# Altium footprint library My Footprint 3D.PCBLIB: 447 footprints (part 26 of 29)
Each footprint in its own frame and in the unit in brackets; x right, y up, seen from the top. Pads: shape width x height; smd on the part's side, far side on the other; paste and mask are expansions set on the pad; w line width, h text height; cw(c..) or ccw(c..) is an arc to the next point about the centre after c.
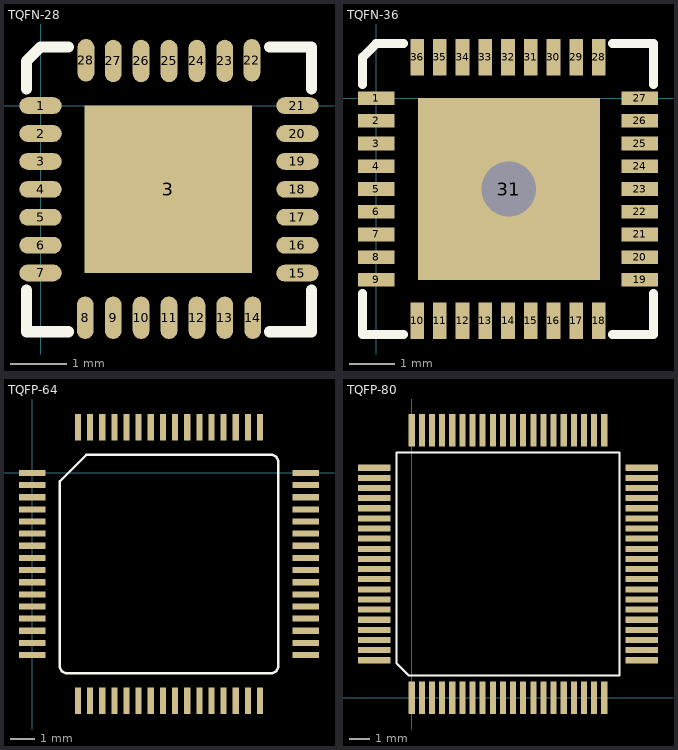
[diagram p25: the footprints below, top view; thin cyan lines are the x and y axes]

## TQFN-28 [mm]
height 1
pads (29):
  oval 0.76x0.3 smd: 1(0,0) 2(0,-0.5) 3(0,-1) 4(0,-1.5) 5(0,-2) 6(0,-2.5) 7(0,-2.997) 15(4.6,-3) 16(4.6,-2.5) 17(4.6,-2) 18(4.6,-1.5) 19(4.6,-1) 20(4.6,-0.5) 21(4.6,0)
  rect 3x3 smd: 3(2.286,-1.5)
  oval 0.3x0.76 smd: 8(0.8,-3.8) 9(1.3,-3.8) 10(1.8,-3.8) 11(2.3,-3.8) 12(2.8,-3.8) 13(3.3,-3.8) 14(3.8,-3.8) 22(3.785,0.813) 23(3.3,0.8) 24(2.8,0.8) 25(2.3,0.8) 26(1.8,0.8) 27(1.3,0.8) 28(0.813,0.813)
Top Overlay:
  lines w0.2: -0.25,-3.3 -0.25,-4.05 0.5,-4.05 ; -0.25,0.3 -0.25,0.8 0,1.05 0.5,1.05 ; 4.1,-4.05 4.85,-4.05 4.85,-3.3 ; 4.1,1.05 4.85,1.05 4.85,0.3

## TQFN-36 [mm]
pads (37):
  rect 0.8x0.3 smd: 1(0,0) 2(0,-0.5) 3(0,-1) 4(0,-1.5) 5(0,-2) 6(0,-2.5) 7(0,-3) 8(0,-3.5) 9(0,-4) 19(5.8,-4) 20(5.8,-3.5) 21(5.8,-3) 22(5.8,-2.5) 23(5.8,-2) 24(5.8,-1.5) 25(5.8,-1) 26(5.8,-0.5) 27(5.8,0)
  rect 0.3x0.8 smd: 10(0.9,-4.9) 11(1.4,-4.9) 12(1.9,-4.9) 13(2.4,-4.9) 14(2.9,-4.9) 15(3.4,-4.9) 16(3.9,-4.9) 17(4.4,-4.9) 18(4.9,-4.9) 28(4.9,0.9) 29(4.4,0.9) 30(3.9,0.9) 31(3.4,0.9) 32(2.9,0.9) 33(2.4,0.9) 34(1.9,0.9) 35(1.4,0.9) 36(0.9,0.9)
  rect 4x4 hole 1.2: 31(2.921,-2)
Top Overlay:
  lines w0.2: -0.3,-4.3 -0.3,-5.2 0.6,-5.2 ; -0.3,0.3 -0.3,0.9 0,1.2 0.6,1.2 ; 5.2,-5.2 6.1,-5.2 6.1,-4.3 ; 5.2,1.2 6.1,1.2 6.1,0.3

## TQFP-64 [mm]
pads (64):
  rect 1.1x0.254 smd: 1(0,0) 2(0,-0.5) 3(0,-1) 4(0,-1.5) 5(0,-2) 6(0,-2.5) 7(0,-3) 8(0,-3.5) 9(0,-4) 10(0,-4.5) 11(0,-5) 12(0,-5.5) 13(0,-6) 14(0,-6.5) 15(0,-7) 16(0,-7.5) 33(11.25,-7.5) 34(11.25,-7) 35(11.25,-6.5) 36(11.25,-6) 37(11.25,-5.5) 38(11.25,-5) 39(11.25,-4.5) 40(11.25,-4) 41(11.25,-3.5) 42(11.25,-3) 43(11.25,-2.5) 44(11.25,-2) 45(11.25,-1.5) 46(11.25,-1) 47(11.25,-0.5) 48(11.25,0)
  rect 0.254x1.1 smd: 17(1.875,-9.375) 18(2.375,-9.375) 19(2.875,-9.375) 20(3.375,-9.375) 21(3.875,-9.375) 22(4.375,-9.375) 23(4.875,-9.375) 24(5.375,-9.375) 25(5.875,-9.375) 26(6.375,-9.375) 27(6.875,-9.375) 28(7.375,-9.375) 29(7.875,-9.375) 30(8.375,-9.375) 31(8.875,-9.375) 32(9.375,-9.375) 49(9.375,1.875) 50(8.875,1.875) 51(8.375,1.875) 52(7.875,1.875) 53(7.375,1.875) 54(6.875,1.875) 55(6.375,1.875) 56(5.875,1.875) 57(5.375,1.875) 58(4.875,1.875) 59(4.375,1.875) 60(3.875,1.875) 61(3.375,1.875) 62(2.875,1.875) 63(2.375,1.875) 64(1.875,1.875)
Top Overlay:
  lines w0.1: 1.125,-7.95 ccw(c1.425,-7.95) 1.425,-8.25 9.825,-8.25 ccw(c9.825,-7.95) 10.125,-7.95 10.125,0.45 ccw(c9.825,0.45) 9.825,0.75 2.225,0.75 1.125,-0.35 1.125,-7.95
3D body: height 1, standoff 0.1, extent 0.623,-8.75 10.628,1.251
3D body: height 1.11, standoff 0.1, extent 1.177,-0.4 2.173,0.598
3D body: height 0.5, standoff 0.3, extent 0.255,-4.11 0.625,-3.89
3D body: height 0.5, standoff 0, extent 0.075,-4.11 0.255,-3.89
3D body: height 0.2, standoff 0, extent -0.375,-4.11 0.075,-3.89
3D body: height 0.2, standoff 0, extent -0.375,-3.61 0.075,-3.39
3D body: height 0.5, standoff 0, extent 0.075,-3.61 0.255,-3.39
3D body: height 0.5, standoff 0.3, extent 0.255,-3.61 0.625,-3.39
3D body: height 0.5, standoff 0.3, extent 0.255,-3.11 0.625,-2.89
3D body: height 0.5, standoff 0, extent 0.075,-3.11 0.255,-2.89
3D body: height 0.2, standoff 0, extent -0.375,-3.11 0.075,-2.89
3D body: height 0.5, standoff 0.3, extent 0.255,-2.61 0.625,-2.39
3D body: height 0.5, standoff 0, extent 0.075,-2.61 0.255,-2.39
3D body: height 0.2, standoff 0, extent -0.375,-2.61 0.075,-2.39
3D body: height 0.5, standoff 0.3, extent 0.255,-2.11 0.625,-1.89
3D body: height 0.5, standoff 0, extent 0.075,-2.11 0.255,-1.89
3D body: height 0.2, standoff 0, extent -0.375,-2.11 0.075,-1.89
3D body: height 0.2, standoff 0, extent -0.375,-0.11 0.075,0.11
3D body: height 0.5, standoff 0, extent 0.075,-0.11 0.255,0.11
3D body: height 0.5, standoff 0.3, extent 0.255,-0.11 0.625,0.11
3D body: height 0.2, standoff 0, extent -0.375,-0.61 0.075,-0.39
3D body: height 0.5, standoff 0, extent 0.075,-0.61 0.255,-0.39
3D body: height 0.5, standoff 0.3, extent 0.255,-0.61 0.625,-0.39
3D body: height 0.2, standoff 0, extent -0.375,-1.11 0.075,-0.89
3D body: height 0.5, standoff 0, extent 0.075,-1.11 0.255,-0.89
3D body: height 0.5, standoff 0.3, extent 0.255,-1.11 0.625,-0.89
3D body: height 0.5, standoff 0.3, extent 0.255,-1.61 0.625,-1.39
3D body: height 0.5, standoff 0, extent 0.075,-1.61 0.255,-1.39
3D body: height 0.2, standoff 0, extent -0.375,-1.61 0.075,-1.39
3D body: height 0.2, standoff 0, extent -0.375,-6.11 0.075,-5.89
3D body: height 0.5, standoff 0, extent 0.075,-6.11 0.255,-5.89
3D body: height 0.5, standoff 0.3, extent 0.255,-6.11 0.625,-5.89
3D body: height 0.2, standoff 0, extent -0.375,-5.61 0.075,-5.39
3D body: height 0.5, standoff 0, extent 0.075,-5.61 0.255,-5.39
3D body: height 0.5, standoff 0.3, extent 0.255,-5.61 0.625,-5.39
3D body: height 0.2, standoff 0, extent -0.375,-5.11 0.075,-4.89
3D body: height 0.5, standoff 0, extent 0.075,-5.11 0.255,-4.89
3D body: height 0.5, standoff 0.3, extent 0.255,-5.11 0.625,-4.89
3D body: height 0.5, standoff 0.3, extent 0.255,-4.61 0.625,-4.39
3D body: height 0.5, standoff 0, extent 0.075,-4.61 0.255,-4.39
3D body: height 0.2, standoff 0, extent -0.375,-4.61 0.075,-4.39
3D body: height 0.2, standoff 0, extent -0.375,-7.61 0.075,-7.39
3D body: height 0.5, standoff 0, extent 0.075,-7.61 0.255,-7.39
3D body: height 0.5, standoff 0.3, extent 0.255,-7.61 0.625,-7.39
3D body: height 0.2, standoff 0, extent -0.375,-7.11 0.075,-6.89
3D body: height 0.5, standoff 0, extent 0.075,-7.11 0.255,-6.89
3D body: height 0.5, standoff 0.3, extent 0.255,-7.11 0.625,-6.89
3D body: height 0.5, standoff 0.3, extent 0.255,-6.61 0.625,-6.39
3D body: height 0.5, standoff 0, extent 0.075,-6.61 0.255,-6.39
3D body: height 0.2, standoff 0, extent -0.375,-6.61 0.075,-6.39
3D body: height 0.2, standoff 0, extent 8.265,-9.75 8.485,-9.3
3D body: height 0.5, standoff 0, extent 8.265,-9.3 8.485,-9.12
3D body: height 0.5, standoff 0.3, extent 8.265,-9.12 8.485,-8.75
3D body: height 0.5, standoff 0.3, extent 8.765,-9.12 8.985,-8.75
3D body: height 0.5, standoff 0, extent 8.765,-9.3 8.985,-9.12
3D body: height 0.2, standoff 0, extent 8.765,-9.75 8.985,-9.3
3D body: height 0.5, standoff 0.3, extent 9.265,-9.12 9.485,-8.75
3D body: height 0.5, standoff 0, extent 9.265,-9.3 9.485,-9.12
3D body: height 0.2, standoff 0, extent 9.265,-9.75 9.485,-9.3
3D body: height 0.2, standoff 0, extent 6.265,-9.75 6.485,-9.3
3D body: height 0.5, standoff 0, extent 6.265,-9.3 6.485,-9.12
3D body: height 0.5, standoff 0.3, extent 6.265,-9.12 6.485,-8.75
3D body: height 0.5, standoff 0.3, extent 6.765,-9.12 6.985,-8.75
3D body: height 0.5, standoff 0, extent 6.765,-9.3 6.985,-9.12
3D body: height 0.2, standoff 0, extent 6.765,-9.75 6.985,-9.3
3D body: height 0.5, standoff 0.3, extent 7.265,-9.12 7.485,-8.75
3D body: height 0.5, standoff 0, extent 7.265,-9.3 7.485,-9.12
3D body: height 0.2, standoff 0, extent 7.265,-9.75 7.485,-9.3
3D body: height 0.5, standoff 0.3, extent 7.765,-9.12 7.985,-8.75
3D body: height 0.5, standoff 0, extent 7.765,-9.3 7.985,-9.12
3D body: height 0.2, standoff 0, extent 7.765,-9.75 7.985,-9.3
3D body: height 0.2, standoff 0, extent 3.265,-9.75 3.485,-9.3
3D body: height 0.5, standoff 0, extent 3.265,-9.3 3.485,-9.12
3D body: height 0.5, standoff 0.3, extent 3.265,-9.12 3.485,-8.75
3D body: height 0.5, standoff 0.3, extent 2.765,-9.12 2.985,-8.75
3D body: height 0.5, standoff 0, extent 2.765,-9.3 2.985,-9.12
3D body: height 0.2, standoff 0, extent 2.765,-9.75 2.985,-9.3
3D body: height 0.5, standoff 0.3, extent 2.265,-9.12 2.485,-8.75
3D body: height 0.5, standoff 0, extent 2.265,-9.3 2.485,-9.12
3D body: height 0.2, standoff 0, extent 2.265,-9.75 2.485,-9.3
3D body: height 0.5, standoff 0.3, extent 1.765,-9.12 1.985,-8.75
3D body: height 0.5, standoff 0, extent 1.765,-9.3 1.985,-9.12
3D body: height 0.2, standoff 0, extent 1.765,-9.75 1.985,-9.3
3D body: height 0.2, standoff 0, extent 3.765,-9.75 3.985,-9.3
3D body: height 0.5, standoff 0, extent 3.765,-9.3 3.985,-9.12
3D body: height 0.5, standoff 0.3, extent 3.765,-9.12 3.985,-8.75
3D body: height 0.2, standoff 0, extent 4.265,-9.75 4.485,-9.3
3D body: height 0.5, standoff 0, extent 4.265,-9.3 4.485,-9.12
3D body: height 0.5, standoff 0.3, extent 4.265,-9.12 4.485,-8.75
3D body: height 0.2, standoff 0, extent 4.765,-9.75 4.985,-9.3
3D body: height 0.5, standoff 0, extent 4.765,-9.3 4.985,-9.12
3D body: height 0.5, standoff 0.3, extent 4.765,-9.12 4.985,-8.75
3D body: height 0.5, standoff 0.3, extent 5.265,-9.12 5.485,-8.75
3D body: height 0.5, standoff 0, extent 5.265,-9.3 5.485,-9.12
3D body: height 0.2, standoff 0, extent 5.265,-9.75 5.485,-9.3
3D body: height 0.2, standoff 0, extent 5.765,-9.75 5.985,-9.3
3D body: height 0.5, standoff 0, extent 5.765,-9.3 5.985,-9.12
3D body: height 0.5, standoff 0.3, extent 5.765,-9.12 5.985,-8.75
3D body: height 0.2, standoff 0, extent 11.175,-1.11 11.625,-0.89
3D body: height 0.5, standoff 0, extent 10.995,-1.11 11.175,-0.89
3D body: height 0.5, standoff 0.3, extent 10.625,-1.11 10.995,-0.89
3D body: height 0.5, standoff 0.3, extent 10.625,-0.61 10.995,-0.39
3D body: height 0.5, standoff 0, extent 10.995,-0.61 11.175,-0.39
3D body: height 0.2, standoff 0, extent 11.175,-0.61 11.625,-0.39
3D body: height 0.5, standoff 0.3, extent 10.625,-0.11 10.995,0.11
3D body: height 0.5, standoff 0, extent 10.995,-0.11 11.175,0.11
3D body: height 0.2, standoff 0, extent 11.175,-0.11 11.625,0.11
3D body: height 0.2, standoff 0, extent 11.175,-3.11 11.625,-2.89
3D body: height 0.5, standoff 0, extent 10.995,-3.11 11.175,-2.89
3D body: height 0.5, standoff 0.3, extent 10.625,-3.11 10.995,-2.89
3D body: height 0.5, standoff 0.3, extent 10.625,-2.61 10.995,-2.39
3D body: height 0.5, standoff 0, extent 10.995,-2.61 11.175,-2.39
3D body: height 0.2, standoff 0, extent 11.175,-2.61 11.625,-2.39
3D body: height 0.5, standoff 0.3, extent 10.625,-2.11 10.995,-1.89
3D body: height 0.5, standoff 0, extent 10.995,-2.11 11.175,-1.89
3D body: height 0.2, standoff 0, extent 11.175,-2.11 11.625,-1.89
3D body: height 0.5, standoff 0.3, extent 10.625,-1.61 10.995,-1.39
3D body: height 0.5, standoff 0, extent 10.995,-1.61 11.175,-1.39
3D body: height 0.2, standoff 0, extent 11.175,-1.61 11.625,-1.39
3D body: height 0.2, standoff 0, extent 11.175,-6.11 11.625,-5.89
3D body: height 0.5, standoff 0, extent 10.995,-6.11 11.175,-5.89
3D body: height 0.5, standoff 0.3, extent 10.625,-6.11 10.995,-5.89
3D body: height 0.5, standoff 0.3, extent 10.625,-6.61 10.995,-6.39
3D body: height 0.5, standoff 0, extent 10.995,-6.61 11.175,-6.39
3D body: height 0.2, standoff 0, extent 11.175,-6.61 11.625,-6.39
3D body: height 0.5, standoff 0.3, extent 10.625,-7.11 10.995,-6.89
3D body: height 0.5, standoff 0, extent 10.995,-7.11 11.175,-6.89
3D body: height 0.2, standoff 0, extent 11.175,-7.11 11.625,-6.89
3D body: height 0.5, standoff 0.3, extent 10.625,-7.61 10.995,-7.39
3D body: height 0.5, standoff 0, extent 10.995,-7.61 11.175,-7.39
3D body: height 0.2, standoff 0, extent 11.175,-7.61 11.625,-7.39
3D body: height 0.2, standoff 0, extent 11.175,-5.61 11.625,-5.39
3D body: height 0.5, standoff 0, extent 10.995,-5.61 11.175,-5.39
3D body: height 0.5, standoff 0.3, extent 10.625,-5.61 10.995,-5.39
3D body: height 0.2, standoff 0, extent 11.175,-5.11 11.625,-4.89
3D body: height 0.5, standoff 0, extent 10.995,-5.11 11.175,-4.89
3D body: height 0.5, standoff 0.3, extent 10.625,-5.11 10.995,-4.89
3D body: height 0.2, standoff 0, extent 11.175,-4.61 11.625,-4.39
3D body: height 0.5, standoff 0, extent 10.995,-4.61 11.175,-4.39
3D body: height 0.5, standoff 0.3, extent 10.625,-4.61 10.995,-4.39
3D body: height 0.5, standoff 0.3, extent 10.625,-4.11 10.995,-3.89
3D body: height 0.5, standoff 0, extent 10.995,-4.11 11.175,-3.89
3D body: height 0.2, standoff 0, extent 11.175,-4.11 11.625,-3.89
3D body: height 0.2, standoff 0, extent 11.175,-3.61 11.625,-3.39
3D body: height 0.5, standoff 0, extent 10.995,-3.61 11.175,-3.39
3D body: height 0.5, standoff 0.3, extent 10.625,-3.61 10.995,-3.39
3D body: height 0.2, standoff 0, extent 2.765,1.8 2.985,2.25
3D body: height 0.5, standoff 0, extent 2.765,1.62 2.985,1.8
3D body: height 0.5, standoff 0.3, extent 2.765,1.25 2.985,1.62
3D body: height 0.5, standoff 0.3, extent 2.265,1.25 2.485,1.62
3D body: height 0.5, standoff 0, extent 2.265,1.62 2.485,1.8
3D body: height 0.2, standoff 0, extent 2.265,1.8 2.485,2.25
3D body: height 0.5, standoff 0.3, extent 1.765,1.25 1.985,1.62
3D body: height 0.5, standoff 0, extent 1.765,1.62 1.985,1.8
3D body: height 0.2, standoff 0, extent 1.765,1.8 1.985,2.25
3D body: height 0.2, standoff 0, extent 4.765,1.8 4.985,2.25
3D body: height 0.5, standoff 0, extent 4.765,1.62 4.985,1.8
3D body: height 0.5, standoff 0.3, extent 4.765,1.25 4.985,1.62
3D body: height 0.5, standoff 0.3, extent 4.265,1.25 4.485,1.62
3D body: height 0.5, standoff 0, extent 4.265,1.62 4.485,1.8
3D body: height 0.2, standoff 0, extent 4.265,1.8 4.485,2.25
3D body: height 0.5, standoff 0.3, extent 3.765,1.25 3.985,1.62
3D body: height 0.5, standoff 0, extent 3.765,1.62 3.985,1.8
3D body: height 0.2, standoff 0, extent 3.765,1.8 3.985,2.25
3D body: height 0.5, standoff 0.3, extent 3.265,1.25 3.485,1.62
3D body: height 0.5, standoff 0, extent 3.265,1.62 3.485,1.8
3D body: height 0.2, standoff 0, extent 3.265,1.8 3.485,2.25
3D body: height 0.2, standoff 0, extent 7.765,1.8 7.985,2.25
3D body: height 0.5, standoff 0, extent 7.765,1.62 7.985,1.8
3D body: height 0.5, standoff 0.3, extent 7.765,1.25 7.985,1.62
3D body: height 0.5, standoff 0.3, extent 8.265,1.25 8.485,1.62
3D body: height 0.5, standoff 0, extent 8.265,1.62 8.485,1.8
3D body: height 0.2, standoff 0, extent 8.265,1.8 8.485,2.25
3D body: height 0.5, standoff 0.3, extent 8.765,1.25 8.985,1.62
3D body: height 0.5, standoff 0, extent 8.765,1.62 8.985,1.8
3D body: height 0.2, standoff 0, extent 8.765,1.8 8.985,2.25
3D body: height 0.5, standoff 0.3, extent 9.265,1.25 9.485,1.62
3D body: height 0.5, standoff 0, extent 9.265,1.62 9.485,1.8
3D body: height 0.2, standoff 0, extent 9.265,1.8 9.485,2.25
3D body: height 0.2, standoff 0, extent 7.265,1.8 7.485,2.25
3D body: height 0.5, standoff 0, extent 7.265,1.62 7.485,1.8
3D body: height 0.5, standoff 0.3, extent 7.265,1.25 7.485,1.62
3D body: height 0.2, standoff 0, extent 6.765,1.8 6.985,2.25
3D body: height 0.5, standoff 0, extent 6.765,1.62 6.985,1.8
3D body: height 0.5, standoff 0.3, extent 6.765,1.25 6.985,1.62
3D body: height 0.2, standoff 0, extent 6.265,1.8 6.485,2.25
3D body: height 0.5, standoff 0, extent 6.265,1.62 6.485,1.8
3D body: height 0.5, standoff 0.3, extent 6.265,1.25 6.485,1.62
3D body: height 0.5, standoff 0.3, extent 5.765,1.25 5.985,1.62
3D body: height 0.5, standoff 0, extent 5.765,1.62 5.985,1.8
3D body: height 0.2, standoff 0, extent 5.765,1.8 5.985,2.25
3D body: height 0.2, standoff 0, extent 5.265,1.8 5.485,2.25
3D body: height 0.5, standoff 0, extent 5.265,1.62 5.485,1.8
3D body: height 0.5, standoff 0.3, extent 5.265,1.25 5.485,1.62

## TQFP-80 [mm]
height 2
pads (80):
  rect 0.3x1.6 smd: 1(0,0) 2(0.5,0) 3(1,0) 4(1.5,0) 5(2,0) 6(2.5,0) 7(3,0) 8(3.5,0) 9(4,0) 10(4.5,0) 11(5,0) 12(5.5,0) 13(6,0) 14(6.5,0) 15(7,0) 16(7.5,0) 17(8,0) 18(8.5,0) 19(9,0) 20(9.5,0) 41(9.5,13.2) 42(9,13.2) 43(8.5,13.2) 44(8,13.2) 45(7.5,13.2) 46(7,13.2) 47(6.5,13.2) 48(6,13.2) 49(5.5,13.2) 50(5,13.2) 51(4.5,13.2) 52(4,13.2) 53(3.5,13.2) 54(3,13.2) 55(2.5,13.2) 56(2,13.2) 57(1.5,13.2) 58(1,13.2) 59(0.5,13.2) 60(0,13.2)
  rect 1.6x0.3 smd: 21(11.35,1.85) 22(11.35,2.35) 23(11.35,2.85) 24(11.35,3.35) 25(11.35,3.85) 26(11.35,4.35) 27(11.35,4.85) 28(11.35,5.35) 29(11.35,5.85) 30(11.35,6.35) 31(11.35,6.85) 32(11.35,7.35) 33(11.35,7.85) 34(11.35,8.35) 35(11.35,8.85) 36(11.35,9.35) 37(11.35,9.85) 38(11.35,10.35) 39(11.35,10.85) 40(11.35,11.35) 61(-1.85,11.35) 62(-1.85,10.85) 63(-1.85,10.35) 64(-1.85,9.85) 65(-1.85,9.35) 66(-1.85,8.85) 67(-1.85,8.35) 68(-1.85,7.85) 69(-1.85,7.35) 70(-1.85,6.85) 71(-1.85,6.35) 72(-1.85,5.85) 73(-1.85,5.35) 74(-1.85,4.85) 75(-1.85,4.35) 76(-1.85,3.85) 77(-1.85,3.35) 78(-1.85,2.85) 79(-1.85,2.35) 80(-1.85,1.85)
Top Overlay:
  lines w0.1: -0.75,1.7 -0.15,1.1 10.25,1.1 10.25,12.1 -0.75,12.1 -0.75,1.7
3D body: height 1, standoff 0.1, extent -1.25,0.6 10.75,12.6
3D body: height 1.11, standoff 0.1, extent -0.598,1.202 0.4,2.198
3D body: height 0.5, standoff 0.3, extent -0.102,0.4 0.102,0.775
3D body: height 0.5, standoff 0, extent -0.102,0.222 0.102,0.4
3D body: height 0.2, standoff 0, extent -0.102,-0.478 0.102,0.222
3D body: height 0.2, standoff 0, extent 0.398,-0.478 0.602,0.222
3D body: height 0.5, standoff 0, extent 0.398,0.222 0.602,0.4
3D body: height 0.5, standoff 0.3, extent 0.398,0.4 0.602,0.775
3D body: height 0.2, standoff 0, extent 0.898,-0.478 1.102,0.222
3D body: height 0.5, standoff 0, extent 0.898,0.222 1.102,0.4
3D body: height 0.5, standoff 0.3, extent 0.898,0.4 1.102,0.775
3D body: height 0.2, standoff 0, extent 1.398,-0.478 1.602,0.222
3D body: height 0.5, standoff 0, extent 1.398,0.222 1.602,0.4
3D body: height 0.5, standoff 0.3, extent 1.398,0.4 1.602,0.775
3D body: height 0.2, standoff 0, extent 1.898,-0.478 2.102,0.222
3D body: height 0.5, standoff 0, extent 1.898,0.222 2.102,0.4
3D body: height 0.5, standoff 0.3, extent 1.898,0.4 2.102,0.775
3D body: height 0.5, standoff 0.3, extent 4.398,0.4 4.602,0.775
3D body: height 0.5, standoff 0, extent 4.398,0.222 4.602,0.4
3D body: height 0.2, standoff 0, extent 4.398,-0.478 4.602,0.222
3D body: height 0.5, standoff 0.3, extent 3.898,0.4 4.102,0.775
3D body: height 0.5, standoff 0, extent 3.898,0.222 4.102,0.4
3D body: height 0.2, standoff 0, extent 3.898,-0.478 4.102,0.222
3D body: height 0.5, standoff 0.3, extent 3.398,0.4 3.602,0.775
3D body: height 0.5, standoff 0, extent 3.398,0.222 3.602,0.4
3D body: height 0.2, standoff 0, extent 3.398,-0.478 3.602,0.222
3D body: height 0.5, standoff 0.3, extent 2.898,0.4 3.102,0.775
3D body: height 0.5, standoff 0, extent 2.898,0.222 3.102,0.4
3D body: height 0.2, standoff 0, extent 2.898,-0.478 3.102,0.222
3D body: height 0.2, standoff 0, extent 2.398,-0.478 2.602,0.222
3D body: height 0.5, standoff 0, extent 2.398,0.222 2.602,0.4
3D body: height 0.5, standoff 0.3, extent 2.398,0.4 2.602,0.775
3D body: height 0.5, standoff 0.3, extent 6.898,0.4 7.102,0.775
3D body: height 0.5, standoff 0, extent 6.898,0.222 7.102,0.4
3D body: height 0.2, standoff 0, extent 6.898,-0.478 7.102,0.222
3D body: height 0.5, standoff 0.3, extent 6.398,0.4 6.602,0.775
3D body: height 0.5, standoff 0, extent 6.398,0.222 6.602,0.4
3D body: height 0.2, standoff 0, extent 6.398,-0.478 6.602,0.222
3D body: height 0.5, standoff 0.3, extent 5.898,0.4 6.102,0.775
3D body: height 0.5, standoff 0, extent 5.898,0.222 6.102,0.4
3D body: height 0.2, standoff 0, extent 5.898,-0.478 6.102,0.222
3D body: height 0.5, standoff 0.3, extent 5.398,0.4 5.602,0.775
3D body: height 0.5, standoff 0, extent 5.398,0.222 5.602,0.4
3D body: height 0.2, standoff 0, extent 5.398,-0.478 5.602,0.222
3D body: height 0.2, standoff 0, extent 4.898,-0.478 5.102,0.222
3D body: height 0.5, standoff 0, extent 4.898,0.222 5.102,0.4
3D body: height 0.5, standoff 0.3, extent 4.898,0.4 5.102,0.775
3D body: height 0.5, standoff 0.3, extent 9.398,0.4 9.602,0.775
3D body: height 0.5, standoff 0, extent 9.398,0.222 9.602,0.4
3D body: height 0.2, standoff 0, extent 9.398,-0.478 9.602,0.222
3D body: height 0.5, standoff 0.3, extent 8.898,0.4 9.102,0.775
3D body: height 0.5, standoff 0, extent 8.898,0.222 9.102,0.4
3D body: height 0.2, standoff 0, extent 8.898,-0.478 9.102,0.222
3D body: height 0.5, standoff 0.3, extent 8.398,0.4 8.602,0.775
3D body: height 0.5, standoff 0, extent 8.398,0.222 8.602,0.4
3D body: height 0.2, standoff 0, extent 8.398,-0.478 8.602,0.222
3D body: height 0.5, standoff 0.3, extent 7.898,0.4 8.102,0.775
3D body: height 0.5, standoff 0, extent 7.898,0.222 8.102,0.4
3D body: height 0.2, standoff 0, extent 7.898,-0.478 8.102,0.222
3D body: height 0.2, standoff 0, extent 7.398,-0.478 7.602,0.222
3D body: height 0.5, standoff 0, extent 7.398,0.222 7.602,0.4
3D body: height 0.5, standoff 0.3, extent 7.398,0.4 7.602,0.775
3D body: height 0.5, standoff 0.3, extent 10.575,9.248 10.95,9.452
3D body: height 0.5, standoff 0, extent 10.95,9.248 11.128,9.452
3D body: height 0.2, standoff 0, extent 11.128,9.248 11.828,9.452
3D body: height 0.2, standoff 0, extent 11.128,9.748 11.828,9.952
3D body: height 0.5, standoff 0, extent 10.95,9.748 11.128,9.952
3D body: height 0.5, standoff 0.3, extent 10.575,9.748 10.95,9.952
3D body: height 0.2, standoff 0, extent 11.128,10.248 11.828,10.452
3D body: height 0.5, standoff 0, extent 10.95,10.248 11.128,10.452
3D body: height 0.5, standoff 0.3, extent 10.575,10.248 10.95,10.452
3D body: height 0.2, standoff 0, extent 11.128,10.748 11.828,10.952
3D body: height 0.5, standoff 0, extent 10.95,10.748 11.128,10.952
3D body: height 0.5, standoff 0.3, extent 10.575,10.748 10.95,10.952
3D body: height 0.2, standoff 0, extent 11.128,11.248 11.828,11.452
3D body: height 0.5, standoff 0, extent 10.95,11.248 11.128,11.452
3D body: height 0.5, standoff 0.3, extent 10.575,11.248 10.95,11.452
3D body: height 0.5, standoff 0.3, extent 10.575,6.748 10.95,6.952
3D body: height 0.5, standoff 0, extent 10.95,6.748 11.128,6.952
3D body: height 0.2, standoff 0, extent 11.128,6.748 11.828,6.952
3D body: height 0.2, standoff 0, extent 11.128,7.248 11.828,7.452
3D body: height 0.5, standoff 0, extent 10.95,7.248 11.128,7.452
3D body: height 0.5, standoff 0.3, extent 10.575,7.248 10.95,7.452
3D body: height 0.2, standoff 0, extent 11.128,7.748 11.828,7.952
3D body: height 0.5, standoff 0, extent 10.95,7.748 11.128,7.952
3D body: height 0.5, standoff 0.3, extent 10.575,7.748 10.95,7.952
3D body: height 0.2, standoff 0, extent 11.128,8.248 11.828,8.452
3D body: height 0.5, standoff 0, extent 10.95,8.248 11.128,8.452
3D body: height 0.5, standoff 0.3, extent 10.575,8.248 10.95,8.452
3D body: height 0.2, standoff 0, extent 11.128,8.748 11.828,8.952
3D body: height 0.5, standoff 0, extent 10.95,8.748 11.128,8.952
3D body: height 0.5, standoff 0.3, extent 10.575,8.748 10.95,8.952
3D body: height 0.5, standoff 0.3, extent 10.575,4.248 10.95,4.452
3D body: height 0.5, standoff 0, extent 10.95,4.248 11.128,4.452
3D body: height 0.2, standoff 0, extent 11.128,4.248 11.828,4.452
3D body: height 0.2, standoff 0, extent 11.128,4.748 11.828,4.952
3D body: height 0.5, standoff 0, extent 10.95,4.748 11.128,4.952
3D body: height 0.5, standoff 0.3, extent 10.575,4.748 10.95,4.952
3D body: height 0.2, standoff 0, extent 11.128,5.248 11.828,5.452
3D body: height 0.5, standoff 0, extent 10.95,5.248 11.128,5.452
3D body: height 0.5, standoff 0.3, extent 10.575,5.248 10.95,5.452
3D body: height 0.2, standoff 0, extent 11.128,5.748 11.828,5.952
3D body: height 0.5, standoff 0, extent 10.95,5.748 11.128,5.952
3D body: height 0.5, standoff 0.3, extent 10.575,5.748 10.95,5.952
3D body: height 0.2, standoff 0, extent 11.128,6.248 11.828,6.452
3D body: height 0.5, standoff 0, extent 10.95,6.248 11.128,6.452
3D body: height 0.5, standoff 0.3, extent 10.575,6.248 10.95,6.452
3D body: height 0.5, standoff 0.3, extent 10.575,3.748 10.95,3.952
3D body: height 0.5, standoff 0, extent 10.95,3.748 11.128,3.952
3D body: height 0.2, standoff 0, extent 11.128,3.748 11.828,3.952
3D body: height 0.5, standoff 0.3, extent 10.575,3.248 10.95,3.452
3D body: height 0.5, standoff 0, extent 10.95,3.248 11.128,3.452
3D body: height 0.2, standoff 0, extent 11.128,3.248 11.828,3.452
3D body: height 0.5, standoff 0.3, extent 10.575,2.748 10.95,2.952
3D body: height 0.5, standoff 0, extent 10.95,2.748 11.128,2.952
3D body: height 0.2, standoff 0, extent 11.128,2.748 11.828,2.952
3D body: height 0.5, standoff 0.3, extent 10.575,2.248 10.95,2.452
3D body: height 0.5, standoff 0, extent 10.95,2.248 11.128,2.452
3D body: height 0.2, standoff 0, extent 11.128,2.248 11.828,2.452
3D body: height 0.2, standoff 0, extent 11.128,1.748 11.828,1.952
3D body: height 0.5, standoff 0, extent 10.95,1.748 11.128,1.952
3D body: height 0.5, standoff 0.3, extent 10.575,1.748 10.95,1.952
3D body: height 0.5, standoff 0.3, extent 1.898,12.425 2.102,12.8
3D body: height 0.5, standoff 0, extent 1.898,12.8 2.102,12.978
3D body: height 0.2, standoff 0, extent 1.898,12.978 2.102,13.678
3D body: height 0.2, standoff 0, extent 1.398,12.978 1.602,13.678
3D body: height 0.5, standoff 0, extent 1.398,12.8 1.602,12.978
3D body: height 0.5, standoff 0.3, extent 1.398,12.425 1.602,12.8
3D body: height 0.2, standoff 0, extent 0.898,12.978 1.102,13.678
3D body: height 0.5, standoff 0, extent 0.898,12.8 1.102,12.978
3D body: height 0.5, standoff 0.3, extent 0.898,12.425 1.102,12.8
3D body: height 0.2, standoff 0, extent 0.398,12.978 0.602,13.678
3D body: height 0.5, standoff 0, extent 0.398,12.8 0.602,12.978
3D body: height 0.5, standoff 0.3, extent 0.398,12.425 0.602,12.8
3D body: height 0.2, standoff 0, extent -0.102,12.978 0.102,13.678
3D body: height 0.5, standoff 0, extent -0.102,12.8 0.102,12.978
3D body: height 0.5, standoff 0.3, extent -0.102,12.425 0.102,12.8
3D body: height 0.5, standoff 0.3, extent 4.398,12.425 4.602,12.8
3D body: height 0.5, standoff 0, extent 4.398,12.8 4.602,12.978
3D body: height 0.2, standoff 0, extent 4.398,12.978 4.602,13.678
3D body: height 0.2, standoff 0, extent 3.898,12.978 4.102,13.678
3D body: height 0.5, standoff 0, extent 3.898,12.8 4.102,12.978
3D body: height 0.5, standoff 0.3, extent 3.898,12.425 4.102,12.8
3D body: height 0.2, standoff 0, extent 3.398,12.978 3.602,13.678
3D body: height 0.5, standoff 0, extent 3.398,12.8 3.602,12.978
3D body: height 0.5, standoff 0.3, extent 3.398,12.425 3.602,12.8
3D body: height 0.2, standoff 0, extent 2.898,12.978 3.102,13.678
3D body: height 0.5, standoff 0, extent 2.898,12.8 3.102,12.978
3D body: height 0.5, standoff 0.3, extent 2.898,12.425 3.102,12.8
3D body: height 0.2, standoff 0, extent 2.398,12.978 2.602,13.678
3D body: height 0.5, standoff 0, extent 2.398,12.8 2.602,12.978
3D body: height 0.5, standoff 0.3, extent 2.398,12.425 2.602,12.8
3D body: height 0.5, standoff 0.3, extent 6.898,12.425 7.102,12.8
3D body: height 0.5, standoff 0, extent 6.898,12.8 7.102,12.978
3D body: height 0.2, standoff 0, extent 6.898,12.978 7.102,13.678
3D body: height 0.2, standoff 0, extent 6.398,12.978 6.602,13.678
3D body: height 0.5, standoff 0, extent 6.398,12.8 6.602,12.978
3D body: height 0.5, standoff 0.3, extent 6.398,12.425 6.602,12.8
3D body: height 0.2, standoff 0, extent 5.898,12.978 6.102,13.678
3D body: height 0.5, standoff 0, extent 5.898,12.8 6.102,12.978
3D body: height 0.5, standoff 0.3, extent 5.898,12.425 6.102,12.8
3D body: height 0.2, standoff 0, extent 5.398,12.978 5.602,13.678
3D body: height 0.5, standoff 0, extent 5.398,12.8 5.602,12.978
3D body: height 0.5, standoff 0.3, extent 5.398,12.425 5.602,12.8
3D body: height 0.2, standoff 0, extent 4.898,12.978 5.102,13.678
3D body: height 0.5, standoff 0, extent 4.898,12.8 5.102,12.978
3D body: height 0.5, standoff 0.3, extent 4.898,12.425 5.102,12.8
3D body: height 0.5, standoff 0.3, extent 7.398,12.425 7.602,12.8
3D body: height 0.5, standoff 0, extent 7.398,12.8 7.602,12.978
3D body: height 0.2, standoff 0, extent 7.398,12.978 7.602,13.678
3D body: height 0.5, standoff 0.3, extent 7.898,12.425 8.102,12.8
3D body: height 0.5, standoff 0, extent 7.898,12.8 8.102,12.978
3D body: height 0.2, standoff 0, extent 7.898,12.978 8.102,13.678
3D body: height 0.5, standoff 0.3, extent 8.398,12.425 8.602,12.8
3D body: height 0.5, standoff 0, extent 8.398,12.8 8.602,12.978
3D body: height 0.2, standoff 0, extent 8.398,12.978 8.602,13.678
3D body: height 0.5, standoff 0.3, extent 8.898,12.425 9.102,12.8
3D body: height 0.5, standoff 0, extent 8.898,12.8 9.102,12.978
3D body: height 0.2, standoff 0, extent 8.898,12.978 9.102,13.678
3D body: height 0.2, standoff 0, extent 9.398,12.978 9.602,13.678
3D body: height 0.5, standoff 0, extent 9.398,12.8 9.602,12.978
3D body: height 0.5, standoff 0.3, extent 9.398,12.425 9.602,12.8
3D body: height 0.5, standoff 0.3, extent -1.45,3.748 -1.075,3.952
3D body: height 0.5, standoff 0, extent -1.628,3.748 -1.45,3.952
3D body: height 0.2, standoff 0, extent -2.328,3.748 -1.628,3.952
3D body: height 0.2, standoff 0, extent -2.328,3.248 -1.628,3.452
3D body: height 0.5, standoff 0, extent -1.628,3.248 -1.45,3.452
3D body: height 0.5, standoff 0.3, extent -1.45,3.248 -1.075,3.452
3D body: height 0.2, standoff 0, extent -2.328,2.748 -1.628,2.952
3D body: height 0.5, standoff 0, extent -1.628,2.748 -1.45,2.952
3D body: height 0.5, standoff 0.3, extent -1.45,2.748 -1.075,2.952
3D body: height 0.2, standoff 0, extent -2.328,2.248 -1.628,2.452
3D body: height 0.5, standoff 0, extent -1.628,2.248 -1.45,2.452
3D body: height 0.5, standoff 0.3, extent -1.45,2.248 -1.075,2.452
3D body: height 0.2, standoff 0, extent -2.328,1.748 -1.628,1.952
3D body: height 0.5, standoff 0, extent -1.628,1.748 -1.45,1.952
3D body: height 0.5, standoff 0.3, extent -1.45,1.748 -1.075,1.952
3D body: height 0.5, standoff 0.3, extent -1.45,6.248 -1.075,6.452
3D body: height 0.5, standoff 0, extent -1.628,6.248 -1.45,6.452
3D body: height 0.2, standoff 0, extent -2.328,6.248 -1.628,6.452
3D body: height 0.2, standoff 0, extent -2.328,5.748 -1.628,5.952
3D body: height 0.5, standoff 0, extent -1.628,5.748 -1.45,5.952
3D body: height 0.5, standoff 0.3, extent -1.45,5.748 -1.075,5.952
3D body: height 0.2, standoff 0, extent -2.328,5.248 -1.628,5.452
3D body: height 0.5, standoff 0, extent -1.628,5.248 -1.45,5.452
3D body: height 0.5, standoff 0.3, extent -1.45,5.248 -1.075,5.452
3D body: height 0.2, standoff 0, extent -2.328,4.748 -1.628,4.952
3D body: height 0.5, standoff 0, extent -1.628,4.748 -1.45,4.952
3D body: height 0.5, standoff 0.3, extent -1.45,4.748 -1.075,4.952
3D body: height 0.2, standoff 0, extent -2.328,4.248 -1.628,4.452
3D body: height 0.5, standoff 0, extent -1.628,4.248 -1.45,4.452
3D body: height 0.5, standoff 0.3, extent -1.45,4.248 -1.075,4.452
3D body: height 0.5, standoff 0.3, extent -1.45,8.748 -1.075,8.952
3D body: height 0.5, standoff 0, extent -1.628,8.748 -1.45,8.952
3D body: height 0.2, standoff 0, extent -2.328,8.748 -1.628,8.952
3D body: height 0.2, standoff 0, extent -2.328,8.248 -1.628,8.452
3D body: height 0.5, standoff 0, extent -1.628,8.248 -1.45,8.452
3D body: height 0.5, standoff 0.3, extent -1.45,8.248 -1.075,8.452
3D body: height 0.2, standoff 0, extent -2.328,7.748 -1.628,7.952
3D body: height 0.5, standoff 0, extent -1.628,7.748 -1.45,7.952
3D body: height 0.5, standoff 0.3, extent -1.45,7.748 -1.075,7.952
3D body: height 0.2, standoff 0, extent -2.328,7.248 -1.628,7.452
3D body: height 0.5, standoff 0, extent -1.628,7.248 -1.45,7.452
3D body: height 0.5, standoff 0.3, extent -1.45,7.248 -1.075,7.452
3D body: height 0.2, standoff 0, extent -2.328,6.748 -1.628,6.952
3D body: height 0.5, standoff 0, extent -1.628,6.748 -1.45,6.952
3D body: height 0.5, standoff 0.3, extent -1.45,6.748 -1.075,6.952
3D body: height 0.5, standoff 0.3, extent -1.45,9.248 -1.075,9.452
3D body: height 0.5, standoff 0, extent -1.628,9.248 -1.45,9.452
3D body: height 0.2, standoff 0, extent -2.328,9.248 -1.628,9.452
3D body: height 0.5, standoff 0.3, extent -1.45,9.748 -1.075,9.952
3D body: height 0.5, standoff 0, extent -1.628,9.748 -1.45,9.952
3D body: height 0.2, standoff 0, extent -2.328,9.748 -1.628,9.952
3D body: height 0.5, standoff 0.3, extent -1.45,10.248 -1.075,10.452
3D body: height 0.5, standoff 0, extent -1.628,10.248 -1.45,10.452
3D body: height 0.2, standoff 0, extent -2.328,10.248 -1.628,10.452
3D body: height 0.5, standoff 0.3, extent -1.45,10.748 -1.075,10.952
3D body: height 0.5, standoff 0, extent -1.628,10.748 -1.45,10.952
3D body: height 0.2, standoff 0, extent -2.328,10.748 -1.628,10.952
3D body: height 0.2, standoff 0, extent -2.328,11.248 -1.628,11.452
3D body: height 0.5, standoff 0, extent -1.628,11.248 -1.45,11.452
3D body: height 0.5, standoff 0.3, extent -1.45,11.248 -1.075,11.452